# Altium footprint library Transformers.PcbLib: 81 footprints (part 2 of 6)
Each footprint in its own frame and in the unit in brackets; x right, y up, seen from the top. Pads: shape width x height; smd on the part's side, far side on the other; paste and mask are expansions set on the pad; w line width, h text height; cw(c..) or ccw(c..) is an arc to the next point about the centre after c.
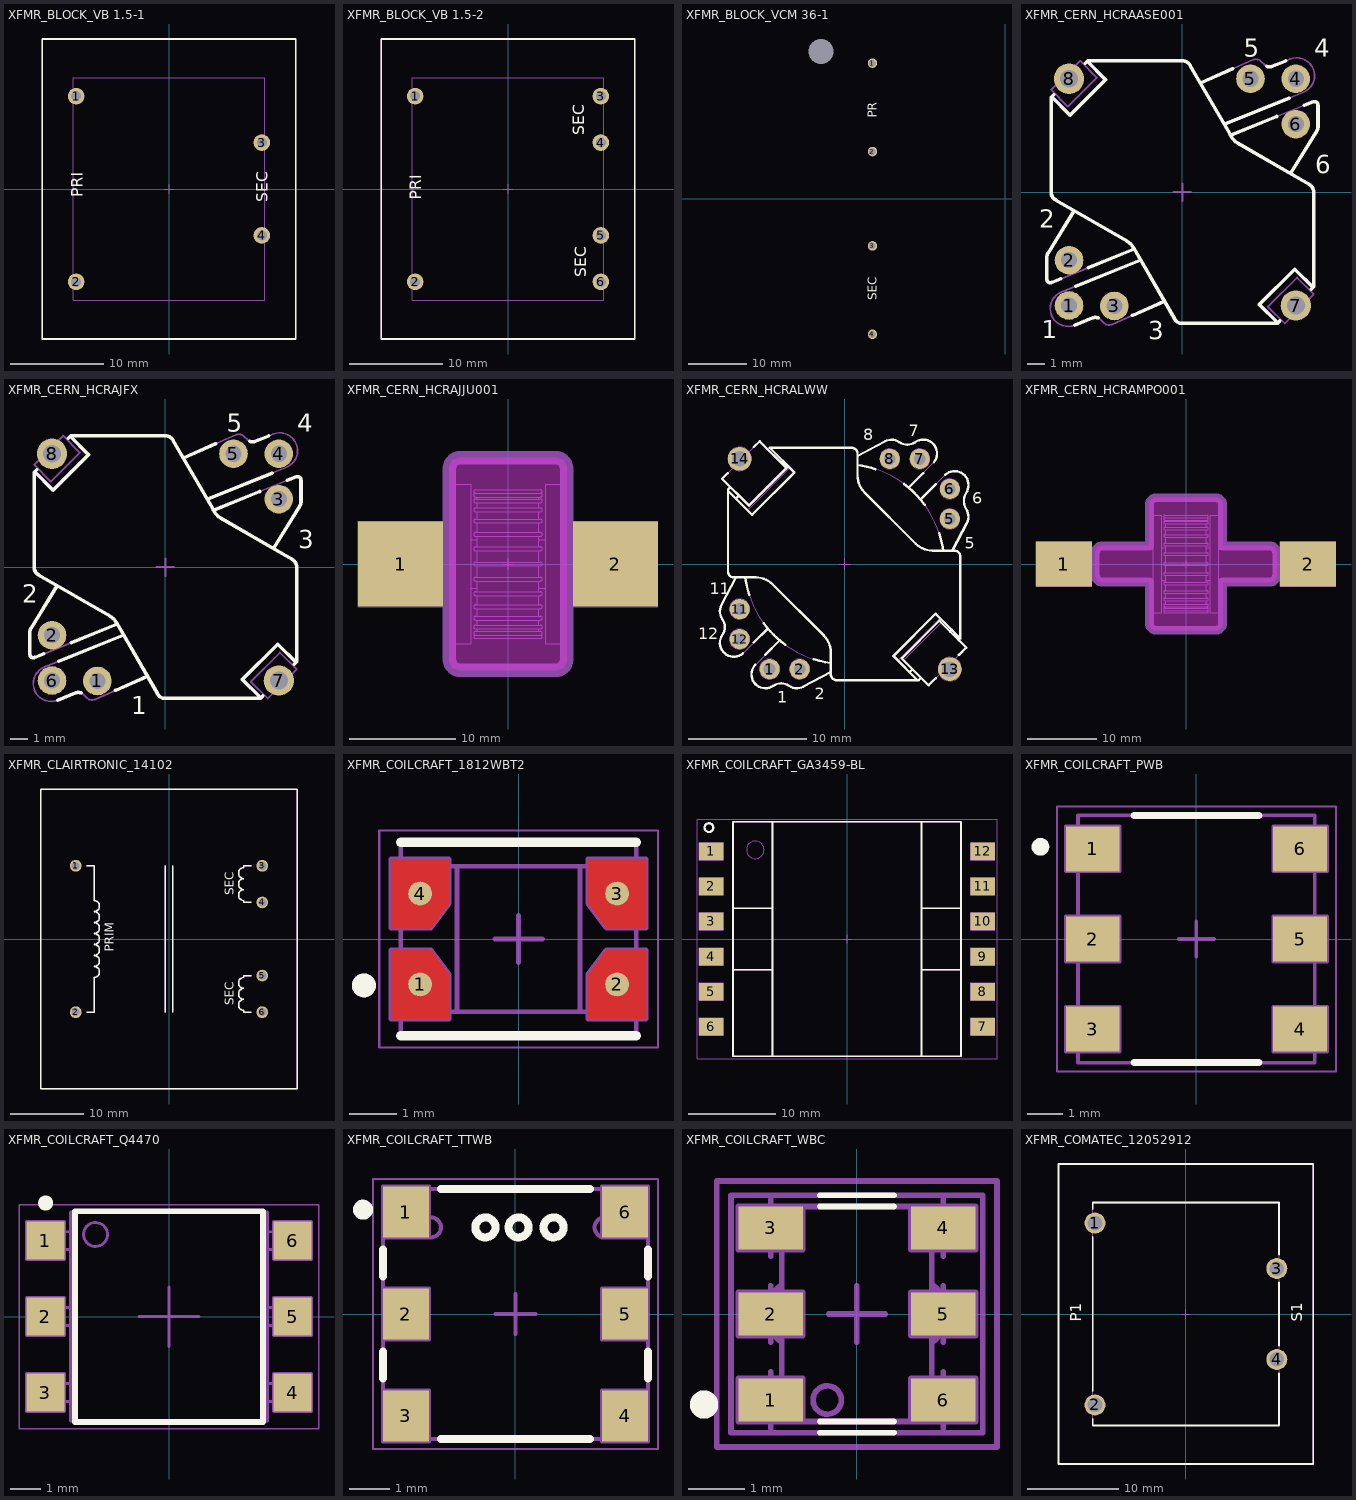
[diagram p1: the footprints below, top view; thin cyan lines are the x and y axes]

## XFMR_BLOCK_VB 1.5-1 [mm] "BLOCK TRANSFORMATOREN Serie VB, Body 27.3mm x 32.3mm"
height 23.8
pads (4):
  round 1.8 hole 1.1: 1(-10,10) 2(-10,-10) 3(10,5) 4(10,-5)
Top Overlay:
  lines w0.2: -13.65,-16.15 13.65,-16.15 13.65,16.15 -13.65,16.15 -13.65,-16.15
  text "SEC" at 10.625,-1.425 h1.2
  text "PRI" at -9.275,-0.875 h1.2
Mechanical 8:
  lines w0.1: -10.5,-10 -10,-10 ; -10.5,10 -10,10 ; -10,-10.5 -10,-10 ; -10,-9.5 -10,-10 ; -10,9.5 -10,10 ; -10,10.5 -10,10 ; -9.5,-10 -10,-10 ; -9.5,10 -10,10 ; -0.5,0 0,0 ; 0,-0.5 0,0 ; 0,0.5 0,0 ; 0.5,0 0,0 ; 9.5,-5 10,-5 ; 9.5,5 10,5 ; 10,-5.5 10,-5 ; 10,-4.5 10,-5 ; 10,4.5 10,5 ; 10,5.5 10,5 ; 10.5,-5 10,-5 ; 10.5,5 10,5
Mechanical 14:
  lines w0.1: -13.65,-16.15 13.65,-16.15 13.65,16.15 -13.65,16.15 -13.65,-16.15 ; -10.3,-12 -10.3,12 10.3,12 10.3,-12 -10.3,-12
  text "SEC" at 10.625,-1.425 h1.2
  text "PRI" at -9.275,-0.875 h1.2
3D body "XFMR_BLOCK_VB 1.5-1.stp": height 23.8, standoff -3.6, extent -13.65,-16.15 13.65,16.15

## XFMR_BLOCK_VB 1.5-2 [mm] "BLOCK TRANSFORMATOREN Serie VB, Body 32.3mm x 27.3mm"
height 23.8
pads (6):
  round 1.8 hole 1.1: 1(-10,10) 2(-10,-10) 3(10,10) 4(10,5) 5(10,-5) 6(10,-10)
Top Overlay:
  lines w0.2: -13.65,-16.15 -13.65,16.15 13.65,16.15 13.65,-16.15 -13.65,-16.15
  text "SEC" at 8.225,5.8 h1.2
  text "SEC" at 8.4,-9.5 h1.2
  text "PRI" at -9.35,-1.175 h1.2
Mechanical 8:
  lines w0.1: -10.5,-10 -10,-10 ; -10.5,10 -10,10 ; -10,-10.5 -10,-10 ; -10,-9.5 -10,-10 ; -10,9.5 -10,10 ; -10,10.5 -10,10 ; -9.5,-10 -10,-10 ; -9.5,10 -10,10 ; -0.5,0 0,0 ; 0,-0.5 0,0 ; 0,0.5 0,0 ; 0.5,0 0,0 ; 9.5,-10 10,-10 ; 9.5,-5 10,-5 ; 9.5,5 10,5 ; 9.5,10 10,10 ; 10,-10.5 10,-10 ; 10,-9.5 10,-10 ; 10,-5.5 10,-5 ; 10,-4.5 10,-5 ; 10,4.5 10,5 ; 10,5.5 10,5 ; 10,9.5 10,10 ; 10,10.5 10,10 ; 10.5,-10 10,-10 ; 10.5,-5 10,-5 ; 10.5,5 10,5 ; 10.5,10 10,10
Mechanical 14:
  lines w0.1: -13.65,-16.15 -13.65,16.15 13.65,16.15 13.65,-16.15 -13.65,-16.15 ; -10.3,-12 10.3,-12 10.3,12 -10.3,12 -10.3,-12
  text "SEC" at 8.225,5.8 h1.2
  text "SEC" at 8.4,-9.5 h1.2
  text "PRI" at -9.35,-1.175 h1.2
3D body "XFMR_BLOCK_VB 1.5-2.stp": height 23.8, standoff -3.8, extent -13.65,-16.15 13.65,16.15

## XFMR_BLOCK_VCM 36-1 [mm] "BLOCK TRANSFORMATOREN Serie VCM 36VA 1 Output, Body 87.2mm x 60mm"
height 48.5
pads (5):
  round 1.6 hole 1.1: 1(-22.5,23) 2(-22.5,8) 3(-22.5,-8) 4(-22.5,-23)
  round 1 hole 4.2 unplated mask+1.6: 12(-31.25,25)
Top Overlay:
  text "PR" at -21.8,13.775 h1.5
  text "SEC" at -21.8,-17.225 h1.5
Mechanical 14:
  text "PR" at -21.8,13.775 h1.5
  text "SEC" at -21.8,-17.225 h1.5

## XFMR_CERN_HCRAASE001 [mm] "CERN HF Power Transformer RM6"
height 12.5
pads (8):
  round 1.6 hole 0.9: 1(-6.35,-6.35) 2(-6.35,-3.81) 3(-3.81,-6.375) 4(6.35,6.35) 5(3.81,6.35) 6(6.35,3.81)
  round 1.7 hole 1: 7(6.35,-6.35) 8(-6.35,6.35)
Top Overlay:
  lines w0.2: -7.322,5.336 -6.293,4.307 -4.304,6.296 -5.333,7.325 ; -7.212,5.445 -7.354,5.303 -7.354,0.001 ccw(c-6.854,0.001) -7.104,-0.432 -3.106,-2.74 cw(c-3.606,-3.606) -2.74,-3.106 -0.432,-7.104 ccw(c0.001,-6.854) 0.001,-7.354 5.303,-7.354 5.445,-7.212 ; -6.824,-4.858 -7.317,-5.058 cw(c-7.392,-4.872) -7.592,-4.872 -7.592,-3.645 cw(c-7.192,-3.645) -7.532,-3.435 -6.055,-1.038 ; -6.027,-7.448 -5.028,-7.044 cw(c-4.878,-7.415) -4.727,-7.044 ; -5.966,-5.266 -2.34,-3.799 ; -5.445,7.212 -5.303,7.354 -0.001,7.354 cw(c-0.001,6.854) 0.432,7.104 2.74,3.106 ccw(c3.606,3.606) 3.106,2.74 7.104,0.432 cw(c6.854,-0.001) 7.354,-0.001 7.354,-5.303 7.212,-5.445 ; -5.281,-4.234 -2.694,-3.187 ; -2.803,-6.905 -1.006,-6.11 ; 1.006,6.11 2.803,6.905 ; 2.34,3.799 5.966,5.266 ; 2.694,3.187 5.281,4.234 ; 4.31,-6.29 5.339,-7.319 4.309,-6.291 6.29,-4.31 ; 4.727,7.044 ccw(c4.878,7.415) 5.028,7.044 5.776,7.347 ; 6.055,1.038 7.532,3.435 ccw(c7.192,3.645) 7.592,3.645 7.592,4.872 ccw(c7.392,4.872) 7.317,5.058 6.824,4.858 ; 7.319,-5.339 6.29,-4.31 ; 7.32,-5.338 6.29,-4.31
  text "2" at -8.025,-2 h1
  text "3" at -1.9,-8.225 h1
  text "5" at 3.425,7.575 h1
  text "6" at 7.425,1.05 h1
  text "4" at 7.375,7.575 h1
  text "1" at -7.875,-8.175 h1
Mechanical 8:
  lines w0.1: -6.85,-6.35 -6.35,-6.35 ; -6.85,-3.81 -6.35,-3.81 ; -6.85,6.35 -6.35,6.35 ; -6.35,-6.85 -6.35,-6.35 ; -6.35,-5.85 -6.35,-6.35 ; -6.35,-4.31 -6.35,-3.81 ; -6.35,-3.31 -6.35,-3.81 ; -6.35,5.85 -6.35,6.35 ; -6.35,6.85 -6.35,6.35 ; -5.85,-6.35 -6.35,-6.35 ; -5.85,-3.81 -6.35,-3.81 ; -5.85,6.35 -6.35,6.35 ; -4.31,-6.35 -3.81,-6.35 ; -3.81,-6.85 -3.81,-6.35 ; -3.81,-5.85 -3.81,-6.35 ; -3.31,-6.35 -3.81,-6.35 ; -0.5,0 0,0 ; 0,-0.5 0,0 ; 0,0.5 0,0 ; 0.5,0 0,0 ; 3.31,6.35 3.81,6.35 ; 3.81,5.85 3.81,6.35 ; 3.81,6.85 3.81,6.35 ; 4.31,6.35 3.81,6.35 ; 5.85,-6.35 6.35,-6.35 ; 5.85,3.81 6.35,3.81 ; 5.85,6.35 6.35,6.35 ; 6.35,-6.85 6.35,-6.35 ; 6.35,-5.85 6.35,-6.35 ; 6.35,3.31 6.35,3.81 ; 6.35,4.31 6.35,3.81 ; 6.35,5.85 6.35,6.35 ; 6.35,6.85 6.35,6.35 ; 6.85,-6.35 6.35,-6.35 ; 6.85,3.81 6.35,3.81 ; 6.85,6.35 6.35,6.35
Mechanical 14:
  lines w0.1: -7.322,5.336 -6.293,4.307 -4.304,6.296 -5.333,7.325 ; -7.142,5.515 -7.354,5.303 -7.354,0.001 ccw(c-6.854,0.001) -7.104,-0.432 -3.106,-2.74 cw(c-3.606,-3.606) -2.74,-3.106 -0.432,-7.104 ccw(c0.001,-6.854) 0.001,-7.354 5.303,-7.354 5.515,-7.142 ; -6.055,-1.038 -7.532,-3.435 ccw(c-7.192,-3.645) -7.592,-3.645 -7.592,-4.872 ccw(c-7.392,-4.872) -7.317,-5.058 -2.694,-3.187 ; -5.515,7.142 -5.303,7.354 -0.001,7.354 cw(c-0.001,6.854) 0.432,7.104 2.74,3.106 ccw(c3.606,3.606) 3.106,2.74 7.104,0.432 cw(c6.854,-0.001) 7.354,-0.001 7.354,-5.303 7.142,-5.515 ; -2.34,-3.799 -6.777,-5.594 ccw(c-6.402,-6.521) -6.027,-7.448 -5.028,-7.044 cw(c-4.878,-7.415) -4.6,-7.127 -4.387,-7.333 ccw(c-4.109,-7.045) -3.947,-7.411 -1.006,-6.11 ; 1.006,6.11 3.947,7.411 cw(c4.109,7.045) 4.387,7.333 4.6,7.127 ccw(c4.878,7.415) 5.028,7.044 6.027,7.448 cw(c6.402,6.521) 6.777,5.594 2.34,3.799 ; 2.694,3.187 7.317,5.058 cw(c7.392,4.872) 7.592,4.872 7.592,3.645 cw(c7.192,3.645) 7.532,3.435 6.055,1.038 ; 4.31,-6.29 5.339,-7.319 4.309,-6.291 6.29,-4.31 ; 7.319,-5.339 6.29,-4.31 ; 7.32,-5.338 6.29,-4.31 ; -7.355,5.728 -6.415,4.789 -4.789,6.415 -5.728,7.355 -7.355,5.728 ; 4.789,-6.415 6.415,-4.789 7.355,-5.728 5.728,-7.355 4.789,-6.415
  text "2" at -8.025,-2 h1
  text "3" at -1.9,-8.225 h1
  text "5" at 3.425,7.575 h1
  text "6" at 7.425,1.05 h1
  text "4" at 7.375,7.575 h1
  text "1" at -7.875,-8.175 h1
3D body "XFMR_CERN_HCRAASE001.stp": height 12.4, standoff -4.12, extent -7.592,-7.513 7.592,7.514

## XFMR_CERN_HCRAJFX [mm] "CERN Current Transformer  RM6"
height 12.5
pads (8):
  round 1.6 hole 0.9: 1(-3.81,-6.375) 2(-6.35,-3.81) 3(6.35,3.81) 4(6.35,6.35) 5(3.81,6.35) 6(-6.35,-6.35)
  round 1.7 hole 1: 7(6.35,-6.35) 8(-6.35,6.35)
Top Overlay:
  lines w0.2: -7.322,5.336 -6.293,4.307 -4.304,6.296 -5.333,7.325 ; -7.212,5.445 -7.354,5.303 -7.354,0.001 ccw(c-6.854,0.001) -7.104,-0.432 -3.106,-2.74 cw(c-3.606,-3.606) -2.74,-3.106 -0.432,-7.104 ccw(c0.001,-6.854) 0.001,-7.354 5.303,-7.354 5.445,-7.212 ; -6.824,-4.858 -7.317,-5.058 cw(c-7.392,-4.872) -7.592,-4.872 -7.592,-3.645 cw(c-7.192,-3.645) -7.532,-3.435 -6.055,-1.038 ; -6.027,-7.448 -5.028,-7.044 cw(c-4.878,-7.415) -4.727,-7.044 ; -5.966,-5.266 -2.34,-3.799 ; -5.445,7.212 -5.303,7.354 -0.001,7.354 cw(c-0.001,6.854) 0.432,7.104 2.74,3.106 ccw(c3.606,3.606) 3.106,2.74 7.104,0.432 cw(c6.854,-0.001) 7.354,-0.001 7.354,-5.303 7.212,-5.445 ; -5.281,-4.234 -2.694,-3.187 ; -2.803,-6.905 -1.006,-6.11 ; 1.006,6.11 2.803,6.905 ; 2.34,3.799 5.966,5.266 ; 2.694,3.187 5.281,4.234 ; 4.31,-6.29 5.339,-7.319 4.309,-6.291 6.29,-4.31 ; 4.727,7.044 ccw(c4.878,7.415) 5.028,7.044 5.776,7.347 ; 6.055,1.038 7.532,3.435 ccw(c7.192,3.645) 7.592,3.645 7.592,4.872 ccw(c7.392,4.872) 7.317,5.058 6.824,4.858 ; 7.319,-5.339 6.29,-4.31 ; 7.32,-5.338 6.29,-4.31
  text "2" at -8.025,-2 h1
  text "1" at -1.9,-8.225 h1
  text "5" at 3.425,7.575 h1
  text "3" at 7.425,1.05 h1
  text "4" at 7.375,7.575 h1
Mechanical 8:
  lines w0.1: -6.85,-6.35 -6.35,-6.35 ; -6.85,-3.81 -6.35,-3.81 ; -6.85,6.35 -6.35,6.35 ; -6.35,-6.85 -6.35,-6.35 ; -6.35,-5.85 -6.35,-6.35 ; -6.35,-4.31 -6.35,-3.81 ; -6.35,-3.31 -6.35,-3.81 ; -6.35,5.85 -6.35,6.35 ; -6.35,6.85 -6.35,6.35 ; -5.85,-6.35 -6.35,-6.35 ; -5.85,-3.81 -6.35,-3.81 ; -5.85,6.35 -6.35,6.35 ; -4.31,-6.35 -3.81,-6.35 ; -3.81,-6.85 -3.81,-6.35 ; -3.81,-5.85 -3.81,-6.35 ; -3.31,-6.35 -3.81,-6.35 ; -0.5,0 0,0 ; 0,-0.5 0,0 ; 0,0.5 0,0 ; 0.5,0 0,0 ; 3.31,6.35 3.81,6.35 ; 3.81,5.85 3.81,6.35 ; 3.81,6.85 3.81,6.35 ; 4.31,6.35 3.81,6.35 ; 5.85,-6.35 6.35,-6.35 ; 5.85,3.81 6.35,3.81 ; 5.85,6.35 6.35,6.35 ; 6.35,-6.85 6.35,-6.35 ; 6.35,-5.85 6.35,-6.35 ; 6.35,3.31 6.35,3.81 ; 6.35,4.31 6.35,3.81 ; 6.35,5.85 6.35,6.35 ; 6.35,6.85 6.35,6.35 ; 6.85,-6.35 6.35,-6.35 ; 6.85,3.81 6.35,3.81 ; 6.85,6.35 6.35,6.35
Mechanical 14:
  lines w0.1: -7.322,5.336 -6.293,4.307 -4.304,6.296 -5.333,7.325 ; -7.142,5.515 -7.354,5.303 -7.354,0.001 ccw(c-6.854,0.001) -7.104,-0.432 -3.106,-2.74 cw(c-3.606,-3.606) -2.74,-3.106 -0.432,-7.104 ccw(c0.001,-6.854) 0.001,-7.354 5.303,-7.354 5.515,-7.142 ; -6.055,-1.038 -7.532,-3.435 ccw(c-7.192,-3.645) -7.592,-3.645 -7.592,-4.872 ccw(c-7.392,-4.872) -7.317,-5.058 -2.694,-3.187 ; -5.515,7.142 -5.303,7.354 -0.001,7.354 cw(c-0.001,6.854) 0.432,7.104 2.74,3.106 ccw(c3.606,3.606) 3.106,2.74 7.104,0.432 cw(c6.854,-0.001) 7.354,-0.001 7.354,-5.303 7.142,-5.515 ; -2.34,-3.799 -6.777,-5.594 ccw(c-6.402,-6.521) -6.027,-7.448 -5.028,-7.044 cw(c-4.878,-7.415) -4.6,-7.127 -4.387,-7.333 ccw(c-4.109,-7.045) -3.947,-7.411 -1.006,-6.11 ; 1.006,6.11 3.947,7.411 cw(c4.109,7.045) 4.387,7.333 4.6,7.127 ccw(c4.878,7.415) 5.028,7.044 6.027,7.448 cw(c6.402,6.521) 6.777,5.594 2.34,3.799 ; 2.694,3.187 7.317,5.058 cw(c7.392,4.872) 7.592,4.872 7.592,3.645 cw(c7.192,3.645) 7.532,3.435 6.055,1.038 ; 4.31,-6.29 5.339,-7.319 4.309,-6.291 6.29,-4.31 ; 7.319,-5.339 6.29,-4.31 ; 7.32,-5.338 6.29,-4.31 ; -7.355,5.728 -6.415,4.789 -4.789,6.415 -5.728,7.355 -7.355,5.728 ; 4.789,-6.415 6.415,-4.789 7.355,-5.728 5.728,-7.355 4.789,-6.415
  text "2" at -8.025,-2 h1
  text "1" at -1.9,-8.225 h1
  text "5" at 3.425,7.575 h1
  text "3" at 7.425,1.05 h1
  text "4" at 7.375,7.575 h1
3D body "XFMR_CERN_HCRAJFX.stp": height 12.4, standoff -4.12, extent -7.592,-7.513 7.592,7.514

## XFMR_CERN_HCRAJJU001 [mm] "CERN HF Current transformer"
height 14
pads (2):
  rect 8x8 smd paste-4 mask+0.1: 1(-10.1,0) 2(10.1,0)
Keep-Out Layer:
  board cut-out: -5.5,-9 -5.5,9 -5.5,9.098 -5.462,9.292 -5.386,9.474 -5.277,9.637 -5.137,9.777 -4.974,9.886 -4.792,9.962 -4.598,10 -4.5,10 4.5,10 4.598,10 4.792,9.962 4.974,9.886 5.137,9.777 5.277,9.637 5.386,9.474 5.462,9.292 5.5,9.098 5.5,9 5.5,-9 5.5,-9.098 5.462,-9.292 5.386,-9.474 5.277,-9.637 5.137,-9.777 4.974,-9.886 4.792,-9.962 4.598,-10 4.5,-10 -4.5,-10 -4.598,-10 -4.792,-9.962 -4.974,-9.886 -5.137,-9.777 -5.277,-9.637 -5.386,-9.474 -5.462,-9.292 -5.5,-9.098
Mechanical 1:
  lines w1.27: -5.5,-9 ccw(c-4.5,-9) -4.5,-10 4.5,-10 ccw(c4.5,-9) 5.5,-9 5.5,9 ccw(c4.5,9) 4.5,10 -4.5,10 ccw(c-4.5,9) -5.5,9 -5.5,-9
Mechanical 8:
  lines w0.1: -10.6,0 -10.1,0 ; -10.1,-0.5 -10.1,0 ; -10.1,0.5 -10.1,0 ; -9.6,0 -10.1,0 ; -0.5,0 0,0 ; 0,-0.5 0,0 ; 0,0.5 0,0 ; 0.5,0 0,0 ; 9.6,0 10.1,0 ; 10.1,-0.5 10.1,0 ; 10.1,0.5 10.1,0 ; 10.6,0 10.1,0 ; -14.1,-4 -6.1,-4 -6.1,4 -14.1,4 -14.1,-4 ; -5.5,-9 ccw(c-4.5,-9) -4.5,-10 4.5,-10 ccw(c4.5,-9) 5.5,-9 5.5,9 ccw(c4.5,9) 4.5,10 -4.5,10 ccw(c-4.5,9) -5.5,9 -5.5,-9 ; 6.1,-4 14.1,-4 14.1,4 6.1,4 6.1,-4
Mechanical 14:
  lines w0.1: -5,-2.3 -8.55,-2.3 -8.55,2.3 -5,2.3 ; -3.5,-2.3 -2.895,-2.3 ; -3.5,2.3 -2.895,2.3 ; -3.138,-6.666 ccw(c-3.05,-6.818) -3.05,-6.993 3.05,-6.993 ccw(c3.05,-6.818) 3.138,-6.666 ; -2.895,-6.34 -2.895,-6.107 ; -2.895,-5.757 -2.895,-5.266 ; -2.895,-4.916 -2.895,-4.201 ; -2.895,-3.851 -2.895,-2.961 ; -2.895,-2.611 -2.895,-1.599 ; -2.895,-1.249 -2.895,-0.175 ; -2.895,0.175 -2.895,1.249 ; -2.895,1.599 -2.895,2.611 ; -2.895,2.961 -2.895,3.87 ; -2.895,4.22 -2.895,4.916 ; -2.895,5.266 -2.895,5.757 ; -2.895,6.107 -2.895,6.286 ; -2.895,6.636 -2.895,6.637 ; 2.895,-6.34 2.895,-6.107 ; 2.895,-5.757 2.895,-5.266 ; 2.895,-4.916 2.895,-4.201 ; 2.895,-3.851 2.895,-2.961 ; 2.895,-2.611 2.895,-1.599 ; 2.895,-2.3 3.5,-2.3 ; 2.895,-1.249 2.895,-0.175 ; 2.895,0.175 2.895,1.249 ; 2.895,1.599 2.895,2.611 ; 2.895,2.3 3.5,2.3 ; 2.895,2.961 2.895,3.87 ; 2.895,4.22 2.895,4.916 ; 2.895,5.266 2.895,5.757 ; 2.895,6.107 2.895,6.286 ; 2.895,6.636 2.895,6.637 ; 5,-2.3 8.55,-2.3 8.55,2.3 5,2.3 ; -5,-7.5 -3.5,-7.5 -3.5,7.5 -5,7.5 -5,-7.5 ; -3.05,-6.69 cw(c-3.05,-6.515) -3.05,-6.34 3.05,-6.34 cw(c3.05,-6.515) 3.05,-6.69 -3.05,-6.69 ; -3.05,-6.107 cw(c-3.05,-5.932) -3.05,-5.757 3.05,-5.757 cw(c3.05,-5.932) 3.05,-6.107 -3.05,-6.107 ; -3.05,-5.266 cw(c-3.05,-5.091) -3.05,-4.916 3.05,-4.916 cw(c3.05,-5.091) 3.05,-5.266 -3.05,-5.266 ; -3.05,-4.201 cw(c-3.05,-4.026) -3.05,-3.851 3.05,-3.851 cw(c3.05,-4.026) 3.05,-4.201 -3.05,-4.201 ; -3.05,-2.961 cw(c-3.05,-2.786) -3.05,-2.611 3.05,-2.611 cw(c3.05,-2.786) 3.05,-2.961 -3.05,-2.961 ; -3.05,-1.599 cw(c-3.05,-1.424) -3.05,-1.249 3.05,-1.249 cw(c3.05,-1.424) 3.05,-1.599 -3.05,-1.599 ; -3.05,-0.175 cw(c-3.05,0) -3.05,0.175 3.05,0.175 cw(c3.05,0) 3.05,-0.175 -3.05,-0.175 ; -3.05,1.249 cw(c-3.05,1.424) -3.05,1.599 3.05,1.599 cw(c3.05,1.424) 3.05,1.249 -3.05,1.249 ; -3.05,2.611 cw(c-3.05,2.786) -3.05,2.961 3.05,2.961 cw(c3.05,2.786) 3.05,2.611 -3.05,2.611 ; -3.05,3.87 cw(c-3.05,4.045) -3.05,4.22 3.05,4.22 cw(c3.05,4.045) 3.05,3.87 -3.05,3.87 ; -3.05,4.916 cw(c-3.05,5.091) -3.05,5.266 3.05,5.266 cw(c3.05,5.091) 3.05,4.916 -3.05,4.916 ; -3.05,5.757 cw(c-3.05,5.932) -3.05,6.107 3.05,6.107 cw(c3.05,5.932) 3.05,5.757 -3.05,5.757 ; -3.05,6.286 cw(c-3.05,6.461) -3.05,6.636 3.05,6.636 cw(c3.05,6.461) 3.05,6.286 -3.05,6.286 ; -3.05,6.637 cw(c-3.05,6.812) -3.05,6.987 3.05,6.987 cw(c3.05,6.812) 3.05,6.637 -3.05,6.637 ; 3.5,-7.5 5,-7.5 5,7.5 3.5,7.5 3.5,-7.5
Drill Drawing:
  lines w0.1: -4.56,4.658 -5.5,5 ; -4.56,5.342 -5.5,5 ; -2.342,-9.06 -2,-10 ; -2.342,9.06 -2,10 ; -1.658,-9.06 -2,-10 ; -1.658,9.06 -2,10 ; -0.5,0 0,0 ; 0,-0.5 0,0 ; 0,0.5 0,0 ; 0.5,0 0,0 ; 1.224,-8.224 3.774,-8.224 5.225,-9.675 ; 4.319,-9.252 5.225,-9.675 ; 4.56,4.658 5.5,5 ; 4.56,5.342 5.5,5 ; 4.802,-8.769 5.225,-9.675 ; -5.5,5 5.5,5 ; -2,-10 -2,10 ; -5.5,-9 ccw(c-4.5,-9) -4.5,-10 4.5,-10 ccw(c4.5,-9) 5.5,-9 5.5,9 ccw(c4.5,9) 4.5,10 -4.5,10 ccw(c-4.5,9) -5.5,9 -5.5,-9
  text "11" at 0.797,5.209 h1
  text "20" at -2.209,-2.791 h1
  text "r1" at 1.892,-8.014 h1
3D body "XFMR_CERN_HCRAJJU001.stp": height 7.5, standoff -7.5, extent -8.55,-7.5 8.55,7.5

## XFMR_CERN_HCRALWW [mm] "CERN HF Power Transformer RM8"
height 16.5
pads (10):
  round 1.7 hole 1: 1(-6.35,-8.89) 2(-3.81,-8.89) 5(8.89,3.81) 6(8.89,6.35) 7(6.35,8.89) 8(3.81,8.89) 11(-8.89,-3.81) 12(-8.89,-6.35)
  round 2 hole 1.3: 13(8.89,-8.89) 14(-8.89,8.89)
Top Overlay:
  lines w0.2: -9.891,7.69 -10.37,7.211 -8.097,4.938 ; -9.664,6.503 -9.874,6.293 -9.874,6.203 ; -9.199,5.528 -8.944,5.783 ; -9.187,-1.131 -10.419,-3.448 ccw(c-9.38,-4) -10.349,-4.668 cw(c-11.318,-5.334) -10.349,-6 ccw(c-9.38,-6.667) -8.601,-7.55 ; -8.42,-1.131 ccw(c-0.045,0) -8.083,-2.61 ; -8.098,4.937 -4.916,8.119 -7.197,10.385 ; -7.69,-6.643 -6.501,-5.454 ; -7.69,9.891 -7.19,10.391 ; -7.55,-8.507 ccw(c-6.713,-9.335) -6.045,-10.304 cw(c-5.379,-11.273) -4.713,-10.304 ccw(c-4.046,-9.335) -3.493,-10.374 -1.176,-9.142 ; -6.851,-5.01 ccw(c-0.045,0) -5.01,-6.839 ; -6.733,-7.69 -5.499,-6.456 ; -6.341,9.826 -4.252,7.737 -7.83,4.159 -9.874,6.203 ; -6.338,9.829 0.586,9.829 cw(c0.586,9.329) 1.086,9.329 1.086,7.475 ccw(c3.086,7.475) 1.672,6.061 6.016,1.717 ccw(c7.43,3.131) 7.43,1.131 9.284,1.131 cw(c9.284,0.631) 9.784,0.631 9.784,-6.293 9.781,-6.296 ; -2.61,-8.053 ccw(c-0.045,0) -1.176,-8.375 ; 1.086,8.375 cw(c-0.045,0) 2.61,8.023 ; 1.086,9.142 3.403,10.374 cw(c3.955,9.334) 4.623,10.304 ccw(c5.289,11.273) 5.955,10.304 cw(c6.639,9.348) 7.55,8.606 ; 5.01,6.773 cw(c-0.045,0) 6.761,5.01 ; 5.409,6.456 6.643,7.69 ; 5.483,-9.154 5.738,-8.899 ; 6.411,5.454 7.69,6.733 ; 6.458,-9.619 6.248,-9.829 6.158,-9.829 ; 7.69,-9.659 7.096,-10.254 4.822,-7.983 8.004,-4.801 10.278,-7.072 ; 7.993,2.61 cw(c-0.045,0) 8.33,1.131 ; 8.511,7.55 cw(c9.3,6.68) 10.259,6 ccw(c11.486,5.334) 10.259,4.668 cw(c9.289,4) 10.329,3.448 9.138,1.209 ; 8.92,-5.717 9.061,-5.576 ; 9.64,-6.437 9.781,-6.296 ; 9.657,-7.69 10.276,-7.071 ; -9.874,6.203 -9.874,-0.631 ccw(c-9.374,-0.631) -9.374,-1.131 -7.52,-1.131 cw(c-7.52,-3.131) -6.106,-1.717 -1.762,-6.061 cw(c-3.176,-7.475) -1.176,-7.475 -1.176,-9.329 ccw(c-0.676,-9.329) -0.676,-9.829 6.158,-9.829 ; 6.158,-9.829 4.114,-7.785 7.692,-4.207 9.781,-6.296
  text "12" at -12.383,-6.35 h1
  text "11" at -11.43,-2.54 h1
  text "8" at 1.587,10.477 h1
  text "7" at 5.397,10.795 h1
  text "6" at 10.795,5.08 h1
  text "5" at 10.16,1.27 h1
  text "2" at -2.54,-11.43 h1
  text "1" at -5.715,-11.747 h1
Mechanical 8:
  circle w0.05: c8.89,-8.89 r1
  circle w0.05: c-8.89,8.89 r1
  circle w0.05: c8.89,3.81 r0.85
  circle w0.05: c8.89,6.35 r0.85
  circle w0.05: c6.35,8.89 r0.85
  circle w0.05: c3.81,8.89 r0.85
  circle w0.05: c-6.35,-8.89 r0.85
  circle w0.05: c-3.81,-8.89 r0.85
  circle w0.05: c-8.89,-3.81 r0.85
  circle w0.05: c-8.89,-6.35 r0.85
  lines w0.05: -9.39,-6.35 -8.89,-6.35 ; -9.39,-3.81 -8.89,-3.81 ; -9.39,8.89 -8.89,8.89 ; -8.89,-6.85 -8.89,-6.35 ; -8.89,-5.85 -8.89,-6.35 ; -8.89,-4.31 -8.89,-3.81 ; -8.89,-3.31 -8.89,-3.81 ; -8.89,8.39 -8.89,8.89 ; -8.89,9.39 -8.89,8.89 ; -8.39,-6.35 -8.89,-6.35 ; -8.39,-3.81 -8.89,-3.81 ; -8.39,8.89 -8.89,8.89 ; -6.85,-8.89 -6.35,-8.89 ; -6.35,-9.39 -6.35,-8.89 ; -6.35,-8.39 -6.35,-8.89 ; -5.85,-8.89 -6.35,-8.89 ; -4.31,-8.89 -3.81,-8.89 ; -3.81,-9.39 -3.81,-8.89 ; -3.81,-8.39 -3.81,-8.89 ; -3.31,-8.89 -3.81,-8.89 ; -0.5,0 0,0 ; 0,-0.5 0,0 ; 0,0.5 0,0 ; 0.5,0 0,0 ; 3.31,8.89 3.81,8.89 ; 3.81,8.39 3.81,8.89 ; 3.81,9.39 3.81,8.89 ; 4.31,8.89 3.81,8.89 ; 5.85,8.89 6.35,8.89 ; 6.35,8.39 6.35,8.89 ; 6.35,9.39 6.35,8.89 ; 6.85,8.89 6.35,8.89 ; 8.39,-8.89 8.89,-8.89 ; 8.39,3.81 8.89,3.81 ; 8.39,6.35 8.89,6.35 ; 8.89,-9.39 8.89,-8.89 ; 8.89,-8.39 8.89,-8.89 ; 8.89,3.31 8.89,3.81 ; 8.89,4.31 8.89,3.81 ; 8.89,5.85 8.89,6.35 ; 8.89,6.85 8.89,6.35 ; 9.39,-8.89 8.89,-8.89 ; 9.39,3.81 8.89,3.81 ; 9.39,6.35 8.89,6.35